# Altium schematic symbol library MCU_ST_STM32H7.SchLib: 191 symbols (part 7 of 8)
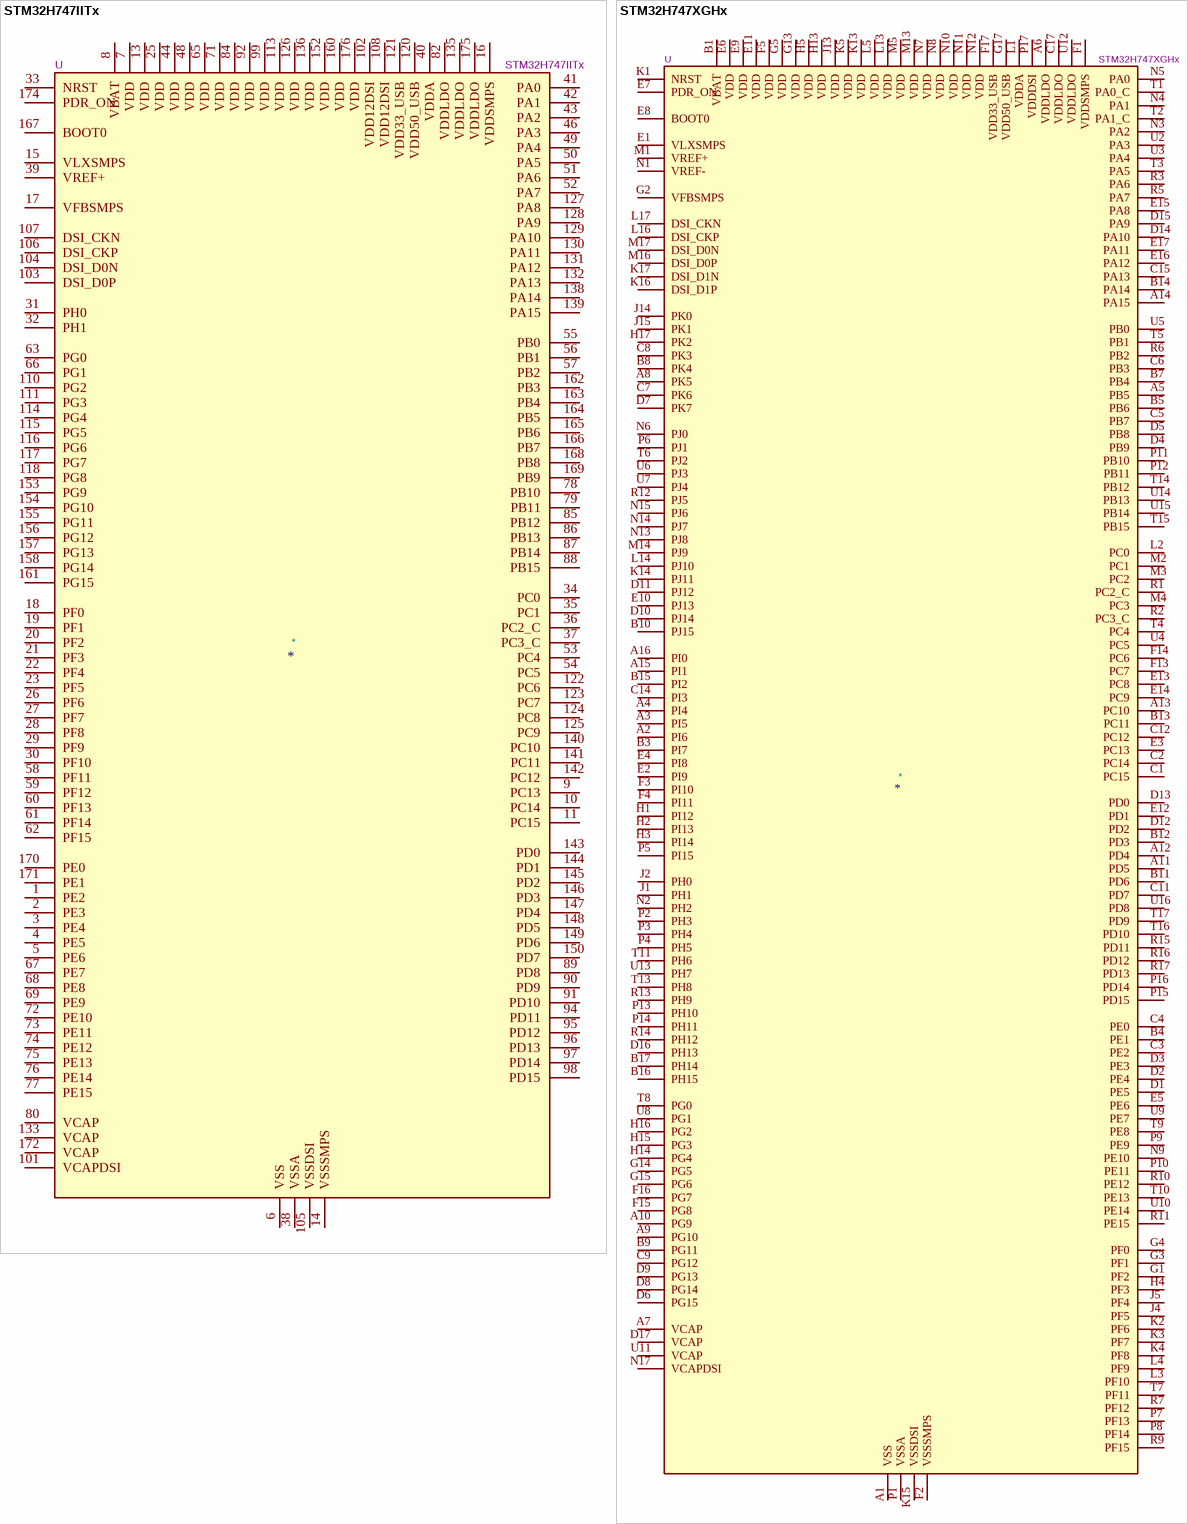
[diagram p72: symbols STM32H747IITx to STM32H747XGHx]

## STM32H747XGHx
designator *  value STM32H747XGHx  Reference: U
ki_keywords: Arm Cortex-M7 STM32H7 STM32H747/757; ki_description: STMicroelectronics Arm Cortex-M7 MCU, 1024KB flash, 1024KB RAM, 480 MHz, 1.62-3.6V, 172 GPIO, TFBGA240; ki_fp_filters: TFBGA*14x14mm*Layout17x17*P0.8mm*; Footprint: Package_BGA:TFBGA-265_14x14mm_Layout17x17_P0.8mm; Datasheet: https://www.st.com/resource/en/datasheet/stm32h747xg.pdf
pins: A1 VSS, A2 PI6, A3 PI5, A4 PI4, A5 PB5, A6 VDDLDO, A7 VCAP, A8 PK5, A9 PG10, A10 PG9, A11 PD5, A12 PD4, A13 PC10, A14 PA15, A15 PI1, A16 PI0, A17 VSS hidden, B1 VBAT, B2 VSS hidden, B3 PI7, B4 PE1, B5 PB6, B6 VSS hidden, B7 PB4, B8 PK4, B9 PG11, B10 PJ15, B11 PD6, B12 PD3, B13 PC11, B14 PA14, B15 PI2, B16 PH15, B17 PH14, C1 PC15, C2 PC14, C3 PE2, C4 PE0, C5 PB7, C6 PB3, C7 PK6, C8 PK3, C9 PG12, C10 VSS hidden, C11 PD7, C12 PC12, C13 VSS hidden, C14 PI3, C15 PA13, C16 VSS hidden, C17 VDDLDO, D1 PE5, D2 PE4, D3 PE3, D4 PB9, D5 PB8, D6 PG15, D7 PK7, D8 PG14, D9 PG13, D10 PJ14, D11 PJ12, D12 PD2, D13 PD0, D14 PA10, D15 PA9, D16 PH13, D17 VCAP, E1 VLXSMPS, E2 PI9, E3 PC13, E4 PI8, E5 PE6, E6 VDD, E7 PDR_ON, E8 BOOT0, E9 VDD, E10 PJ13, E11 VDD, E12 PD1, E13 PC8, E14 PC9, E15 PA8, E16 PA12, E17 PA11, F1 VDDSMPS, F2 VSSSMPS, F3 PI10, F4 PI11, F5 VDD, F13 PC7, F14 PC6, F15 PG8, F16 PG7, F17 VDD33_USB, G1 PF2, G2 VFBSMPS, G3 PF1, G4 PF0, G5 VDD, G7 VSS hidden, G8 VSS hidden, G9 VSS hidden, G10 VSS hidden, G11 VSS hidden, G13 VDD, G14 PG5, G15 PG6, G16 VSS hidden, G17 VDD50_USB, H1 PI12, H2 PI13, H3 PI14, H4 PF3, H5 VDD, H7 VSS hidden, H8 VSS hidden, H9 VSS hidden, H10 VSS hidden, H11 VSS hidden, H13 VDD, H14 PG4, H15 PG3, H16 PG2, H17 PK2, J1 PH1, J2 PH0, J3 VSS hidden, J4 PF5, J5 PF4, J7 VSS hidden, J8 VSS hidden, J9 VSS hidden, J10 VSS hidden, J11 VSS hidden, J13 VDD, J14 PK0, J15 PK1, J16 VSS hidden, J17 VSS hidden, K1 NRST, K2 PF6, K3 PF7, K4 PF8, K5 VDD, K7 VSS hidden, K8 VSS hidden, K9 VSS hidden, K10 VSS hidden, K11 VSS hidden, K13 VDD, K14 PJ11, K15 VSSDSI, K16 DSI_D1P, K17 DSI_D1N, L1 VDDA, L2 PC0, L3 PF10, L4 PF9, L5 VDD, L7 VSS hidden, L8 VSS hidden, L9 VSS hidden, L10 VSS hidden, L11 VSS hidden, L13 VDD, L14 PJ10, L15 VSSDSI hidden, L16 DSI_CKP, L17 DSI_CKN, M1 VREF+, M2 PC1, M3 PC2, M4 PC3, M5 VDD, M13 VDD, M14 PJ9, M15 VSSDSI hidden, M16 DSI_D0P, M17 DSI_D0N, N1 VREF-, N2 PH2, N3 PA2, N4 PA1, N5 PA0, N6 PJ0, N7 VDD, N8 VDD, N9 PE10, N10 VDD, N11 VDD, N12 VDD, N13 PJ8, N14 PJ7, N15 PJ6, N16 VSS hidden, N17 VCAPDSI, P1 VSSA, P2 PH3, P3 PH4, P4 PH5, P5 PI15, P6 PJ1, P7 PF13, P8 PF14, P9 PE9, P10 PE11, P11 PB10, P12 PB11, P13 PH10, P14 PH11, P15 PD15, P16 PD14, P17 VDDDSI, R1 PC2_C, R2 PC3_C, R3 PA6, R4 VSS hidden, R5 PA7, R6 PB2, R7 PF12, R8 VSS hidden, R9 PF15, R10 PE12, R11 PE15, R12 PJ5, R13 PH9, R14 PH12, R15 PD11, R16 PD12, R17 PD13, T1 PA0_C, T2 PA1_C, T3 PA5, T4 PC4, T5 PB1, T6 PJ2, T7 PF11, T8 PG0, T9 PE8, T10 PE13, T11 PH6, T12 VSS hidden, T13 PH8, T14 PB12, T15 PB15, T16 PD10, T17 PD9, U1 VSS hidden, U2 PA3, U3 PA4, U4 PC5, U5 PB0, U6 PJ3, U7 PJ4, U8 PG1, U9 PE7, U10 PE14, U11 VCAP, U12 VDDLDO, U13 PH7, U14 PB13, U15 PB14, U16 PD8, U17 VSS hidden

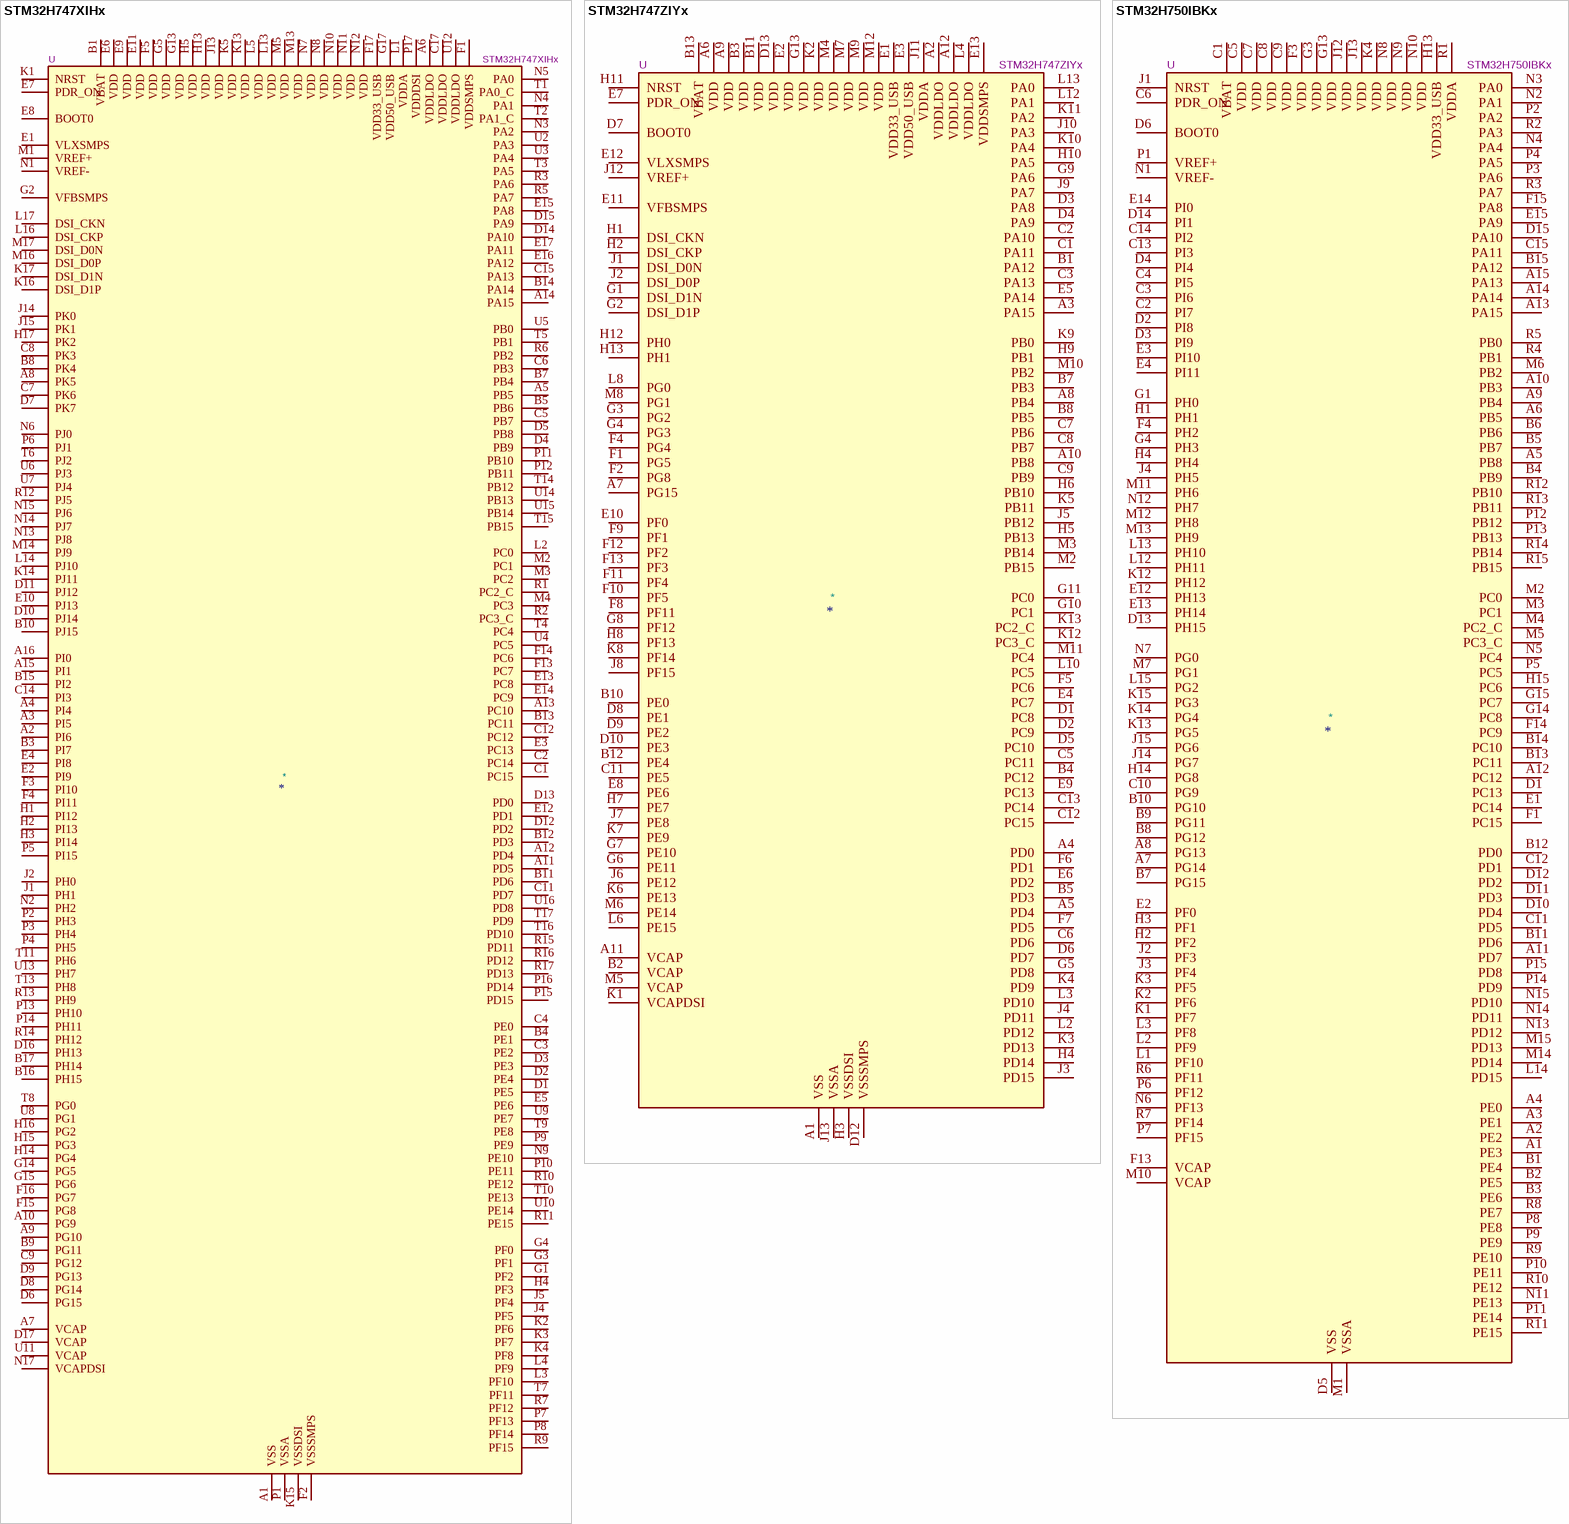
[diagram p57: symbols STM32H747XIHx to STM32H750IBKx]

## STM32H747XIHx
designator *  value STM32H747XIHx  Reference: U
ki_keywords: Arm Cortex-M7 STM32H7 STM32H747/757; ki_description: STMicroelectronics Arm Cortex-M7 MCU, 2048KB flash, 1024KB RAM, 480 MHz, 1.62-3.6V, 172 GPIO, TFBGA240; ki_fp_filters: TFBGA*14x14mm*Layout17x17*P0.8mm*; Footprint: Package_BGA:TFBGA-265_14x14mm_Layout17x17_P0.8mm; Datasheet: https://www.st.com/resource/en/datasheet/stm32h747xi.pdf
pins: A1 VSS, A2 PI6, A3 PI5, A4 PI4, A5 PB5, A6 VDDLDO, A7 VCAP, A8 PK5, A9 PG10, A10 PG9, A11 PD5, A12 PD4, A13 PC10, A14 PA15, A15 PI1, A16 PI0, A17 VSS hidden, B1 VBAT, B2 VSS hidden, B3 PI7, B4 PE1, B5 PB6, B6 VSS hidden, B7 PB4, B8 PK4, B9 PG11, B10 PJ15, B11 PD6, B12 PD3, B13 PC11, B14 PA14, B15 PI2, B16 PH15, B17 PH14, C1 PC15, C2 PC14, C3 PE2, C4 PE0, C5 PB7, C6 PB3, C7 PK6, C8 PK3, C9 PG12, C10 VSS hidden, C11 PD7, C12 PC12, C13 VSS hidden, C14 PI3, C15 PA13, C16 VSS hidden, C17 VDDLDO, D1 PE5, D2 PE4, D3 PE3, D4 PB9, D5 PB8, D6 PG15, D7 PK7, D8 PG14, D9 PG13, D10 PJ14, D11 PJ12, D12 PD2, D13 PD0, D14 PA10, D15 PA9, D16 PH13, D17 VCAP, E1 VLXSMPS, E2 PI9, E3 PC13, E4 PI8, E5 PE6, E6 VDD, E7 PDR_ON, E8 BOOT0, E9 VDD, E10 PJ13, E11 VDD, E12 PD1, E13 PC8, E14 PC9, E15 PA8, E16 PA12, E17 PA11, F1 VDDSMPS, F2 VSSSMPS, F3 PI10, F4 PI11, F5 VDD, F13 PC7, F14 PC6, F15 PG8, F16 PG7, F17 VDD33_USB, G1 PF2, G2 VFBSMPS, G3 PF1, G4 PF0, G5 VDD, G7 VSS hidden, G8 VSS hidden, G9 VSS hidden, G10 VSS hidden, G11 VSS hidden, G13 VDD, G14 PG5, G15 PG6, G16 VSS hidden, G17 VDD50_USB, H1 PI12, H2 PI13, H3 PI14, H4 PF3, H5 VDD, H7 VSS hidden, H8 VSS hidden, H9 VSS hidden, H10 VSS hidden, H11 VSS hidden, H13 VDD, H14 PG4, H15 PG3, H16 PG2, H17 PK2, J1 PH1, J2 PH0, J3 VSS hidden, J4 PF5, J5 PF4, J7 VSS hidden, J8 VSS hidden, J9 VSS hidden, J10 VSS hidden, J11 VSS hidden, J13 VDD, J14 PK0, J15 PK1, J16 VSS hidden, J17 VSS hidden, K1 NRST, K2 PF6, K3 PF7, K4 PF8, K5 VDD, K7 VSS hidden, K8 VSS hidden, K9 VSS hidden, K10 VSS hidden, K11 VSS hidden, K13 VDD, K14 PJ11, K15 VSSDSI, K16 DSI_D1P, K17 DSI_D1N, L1 VDDA, L2 PC0, L3 PF10, L4 PF9, L5 VDD, L7 VSS hidden, L8 VSS hidden, L9 VSS hidden, L10 VSS hidden, L11 VSS hidden, L13 VDD, L14 PJ10, L15 VSSDSI hidden, L16 DSI_CKP, L17 DSI_CKN, M1 VREF+, M2 PC1, M3 PC2, M4 PC3, M5 VDD, M13 VDD, M14 PJ9, M15 VSSDSI hidden, M16 DSI_D0P, M17 DSI_D0N, N1 VREF-, N2 PH2, N3 PA2, N4 PA1, N5 PA0, N6 PJ0, N7 VDD, N8 VDD, N9 PE10, N10 VDD, N11 VDD, N12 VDD, N13 PJ8, N14 PJ7, N15 PJ6, N16 VSS hidden, N17 VCAPDSI, P1 VSSA, P2 PH3, P3 PH4, P4 PH5, P5 PI15, P6 PJ1, P7 PF13, P8 PF14, P9 PE9, P10 PE11, P11 PB10, P12 PB11, P13 PH10, P14 PH11, P15 PD15, P16 PD14, P17 VDDDSI, R1 PC2_C, R2 PC3_C, R3 PA6, R4 VSS hidden, R5 PA7, R6 PB2, R7 PF12, R8 VSS hidden, R9 PF15, R10 PE12, R11 PE15, R12 PJ5, R13 PH9, R14 PH12, R15 PD11, R16 PD12, R17 PD13, T1 PA0_C, T2 PA1_C, T3 PA5, T4 PC4, T5 PB1, T6 PJ2, T7 PF11, T8 PG0, T9 PE8, T10 PE13, T11 PH6, T12 VSS hidden, T13 PH8, T14 PB12, T15 PB15, T16 PD10, T17 PD9, U1 VSS hidden, U2 PA3, U3 PA4, U4 PC5, U5 PB0, U6 PJ3, U7 PJ4, U8 PG1, U9 PE7, U10 PE14, U11 VCAP, U12 VDDLDO, U13 PH7, U14 PB13, U15 PB14, U16 PD8, U17 VSS hidden

## STM32H747ZIYx
designator *  value STM32H747ZIYx  Reference: U
ki_keywords: Arm Cortex-M7 STM32H7 STM32H747/757; ki_description: STMicroelectronics Arm Cortex-M7 MCU, 2048KB flash, 1024KB RAM, 480 MHz, 1.62-3.6V, 101 GPIO, WLCSP156; Footprint: Package_CSP:ST_WLCSP-156_4.96x4.64mm_Layout13x12_P0.35mm; Datasheet: https://www.st.com/resource/en/datasheet/stm32h747zi.pdf; ki_fp_filters: *
pins: A1 VSS, A2 VDDLDO, A3 PA15, A4 PD0, A5 PD4, A6 VDD, A7 PG15, A8 PB4, A9 VDD, A10 PB8, A11 VCAP, A12 VDDLDO, A13 DNC hidden, B1 PA12, B2 VCAP, B3 VDD, B4 PC12, B5 PD3, B6 VSS hidden, B7 PB3, B8 PB5, B9 VSS hidden, B10 PE0, B11 VDD, B12 PE4, B13 VBAT, C1 PA11, C2 PA10, C3 PA13, C4 VSS hidden, C5 PC11, C6 PD6, C7 PB6, C8 PB7, C9 PB9, C10 VSS hidden, C11 PE5, C12 PC15, C13 PC14, D1 PC8, D2 PC9, D3 PA8, D4 PA9, D5 PC10, D6 PD7, D7 BOOT0, D8 PE1, D9 PE2, D10 PE3, D11 VSS hidden, D12 VSSSMPS, D13 VDD, E1 VDD33_USB, E2 VDD, E3 VDD50_USB, E4 PC7, E5 PA14, E6 PD2, E7 PDR_ON, E8 PE6, E9 PC13, E10 PF0, E11 VFBSMPS, E12 VLXSMPS, E13 VDDSMPS, F1 PG5, F2 PG8, F3 VSS hidden, F4 PG4, F5 PC6, F6 PD1, F7 PD5, F8 PF11, F9 PF1, F10 PF5, F11 PF4, F12 PF2, F13 PF3, G1 DSI_D1N, G2 DSI_D1P, G3 PG2, G4 PG3, G5 PD8, G6 PE11, G7 PE10, G8 PF12, G9 PA6, G10 PC1, G11 PC0, G12 VSS hidden, G13 VDD, H1 DSI_CKN, H2 DSI_CKP, H3 VSSDSI, H4 PD14, H5 PB13, H6 PB10, H7 PE7, H8 PF13, H9 PB1, H10 PA5, H11 NRST, H12 PH0, H13 PH1, J1 DSI_D0N, J2 DSI_D0P, J3 PD15, J4 PD11, J5 PB12, J6 PE12, J7 PE8, J8 PF15, J9 PA7, J10 PA3, J11 VDDA, J12 VREF+, J13 VSSA, K1 VCAPDSI, K2 VDD, K3 PD13, K4 PD9, K5 PB11, K6 PE13, K7 PE9, K8 PF14, K9 PB0, K10 PA4, K11 PA2, K12 PC3_C, K13 PC2_C, L1 VSS hidden, L2 PD12, L3 PD10, L4 VDDLDO, L5 VSS hidden, L6 PE15, L7 VSS hidden, L8 PG0, L9 VSS hidden, L10 PC5, L11 VSS hidden, L12 PA1, L13 PA0, M1 VSS hidden, M2 PB15, M3 PB14, M4 VDD, M5 VCAP, M6 PE14, M7 VDD, M8 PG1, M9 VDD, M10 PB2, M11 PC4, M12 VDD, M13 VSS hidden

## STM32H750IBKx
designator *  value STM32H750IBKx  Reference: U
ki_keywords: Arm Cortex-M7 STM32H7 STM32H750 Value line; ki_description: STMicroelectronics Arm Cortex-M7 MCU, 128KB flash, 1024KB RAM, 480 MHz, 1.62-3.6V, 140 GPIO, UFBGA176; ki_fp_filters: *UFBGA*10x10mm*Layout15x15*P0.65mm*; Footprint: Package_BGA:UFBGA-201_10x10mm_Layout15x15_P0.65mm; Datasheet: https://www.st.com/resource/en/datasheet/stm32h750ib.pdf
pins: A1 PE3, A2 PE2, A3 PE1, A4 PE0, A5 PB8, A6 PB5, A7 PG14, A8 PG13, A9 PB4, A10 PB3, A11 PD7, A12 PC12, A13 PA15, A14 PA14, A15 PA13, B1 PE4, B2 PE5, B3 PE6, B4 PB9, B5 PB7, B6 PB6, B7 PG15, B8 PG12, B9 PG11, B10 PG10, B11 PD6, B12 PD0, B13 PC11, B14 PC10, B15 PA12, C1 VBAT, C2 PI7, C3 PI6, C4 PI5, C5 VDD, C6 PDR_ON, C7 VDD, C8 VDD, C9 VDD, C10 PG9, C11 PD5, C12 PD1, C13 PI3, C14 PI2, C15 PA11, D1 PC13, D2 PI8, D3 PI9, D4 PI4, D5 VSS, D6 BOOT0, D7 VSS hidden, D8 VSS hidden, D9 VSS hidden, D10 PD4, D11 PD3, D12 PD2, D13 PH15, D14 PI1, D15 PA10, E1 PC14, E2 PF0, E3 PI10, E4 PI11, E12 PH13, E13 PH14, E14 PI0, E15 PA9, F1 PC15, F2 VSS hidden, F3 VDD, F4 PH2, F6 VSS hidden, F7 VSS hidden, F8 VSS hidden, F9 VSS hidden, F10 VSS hidden, F12 VSS hidden, F13 VCAP, F14 PC9, F15 PA8, G1 PH0, G2 VSS hidden, G3 VDD, G4 PH3, G6 VSS hidden, G7 VSS hidden, G8 VSS hidden, G9 VSS hidden, G10 VSS hidden, G12 VSS hidden, G13 VDD, G14 PC8, G15 PC7, H1 PH1, H2 PF2, H3 PF1, H4 PH4, H6 VSS hidden, H7 VSS hidden, H8 VSS hidden, H9 VSS hidden, H10 VSS hidden, H12 VSS hidden, H13 VDD33_USB, H14 PG8, H15 PC6, J1 NRST, J2 PF3, J3 PF4, J4 PH5, J6 VSS hidden, J7 VSS hidden, J8 VSS hidden, J9 VSS hidden, J10 VSS hidden, J12 VDD, J13 VDD, J14 PG7, J15 PG6, K1 PF7, K2 PF6, K3 PF5, K4 VDD, K6 VSS hidden, K7 VSS hidden, K8 VSS hidden, K9 VSS hidden, K10 VSS hidden, K12 PH12, K13 PG5, K14 PG4, K15 PG3, L1 PF10, L2 PF9, L3 PF8, L4 VSS hidden, L12 PH11, L13 PH10, L14 PD15, L15 PG2, M1 VSSA, M2 PC0, M3 PC1, M4 PC2_C, M5 PC3_C, M6 PB2, M7 PG1, M8 VSS hidden, M9 VSS hidden, M10 VCAP, M11 PH6, M12 PH8, M13 PH9, M14 PD14, M15 PD13, N1 VREF-, N2 PA1, N3 PA0, N4 PA4, N5 PC4, N6 PF13, N7 PG0, N8 VDD, N9 VDD, N10 VDD, N11 PE13, N12 PH7, N13 PD12, N14 PD11, N15 PD10, P1 VREF+, P2 PA2, P3 PA6, P4 PA5, P5 PC5, P6 PF12, P7 PF15, P8 PE8, P9 PE9, P10 PE11, P11 PE14, P12 PB12, P13 PB13, P14 PD9, P15 PD8, R1 VDDA, R2 PA3, R3 PA7, R4 PB1, R5 PB0, R6 PF11, R7 PF14, R8 PE7, R9 PE10, R10 PE12, R11 PE15, R12 PB10, R13 PB11, R14 PB14, R15 PB15

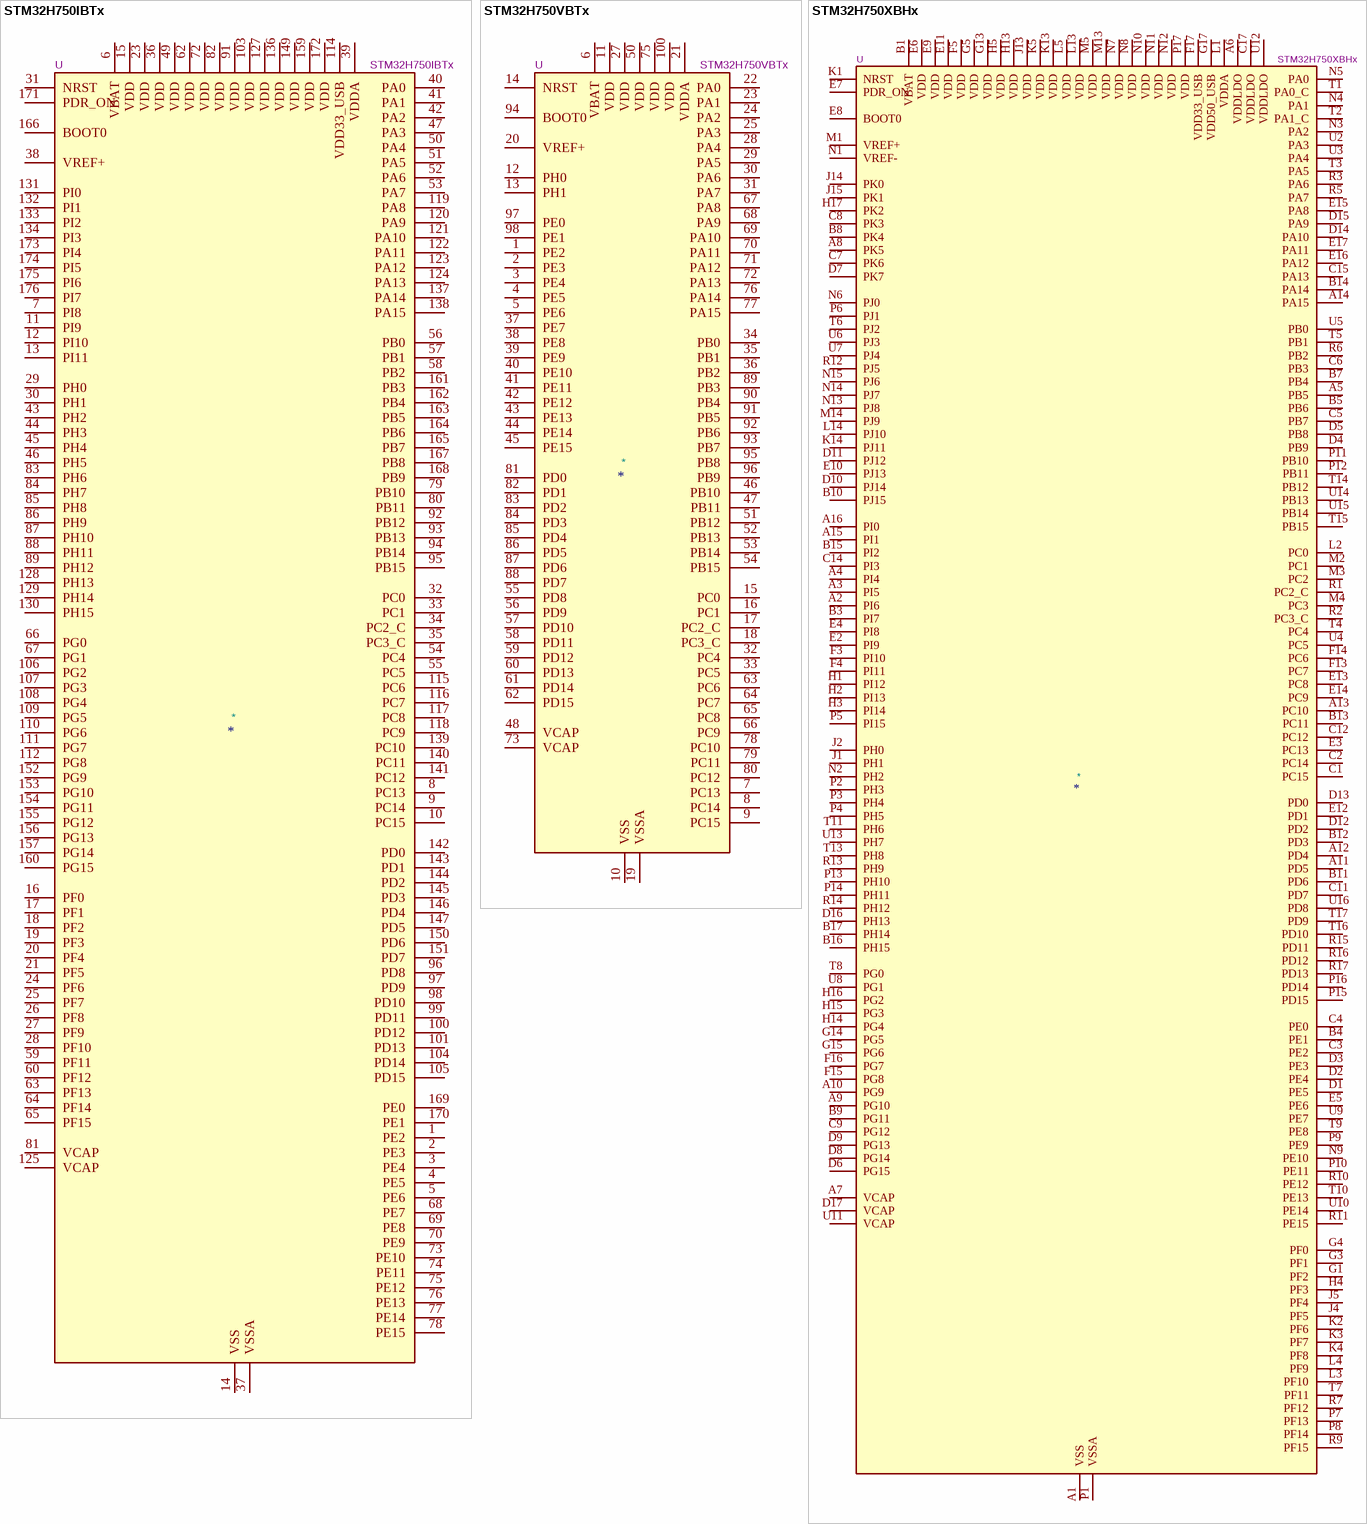
[diagram p58: symbols STM32H750IBTx to STM32H750XBHx]

## STM32H750IBTx
designator *  value STM32H750IBTx  Reference: U
ki_keywords: Arm Cortex-M7 STM32H7 STM32H750 Value line; ki_description: STMicroelectronics Arm Cortex-M7 MCU, 128KB flash, 1024KB RAM, 480 MHz, 1.62-3.6V, 140 GPIO, LQFP176; ki_fp_filters: LQFP*24x24mm*P0.5mm*; Footprint: Package_QFP:LQFP-176_24x24mm_P0.5mm; Datasheet: https://www.st.com/resource/en/datasheet/stm32h750ib.pdf
pins: 1 PE2, 2 PE3, 3 PE4, 4 PE5, 5 PE6, 6 VBAT, 7 PI8, 8 PC13, 9 PC14, 10 PC15, 11 PI9, 12 PI10, 13 PI11, 14 VSS, 15 VDD, 16 PF0, 17 PF1, 18 PF2, 19 PF3, 20 PF4, 21 PF5, 22 VSS hidden, 23 VDD, 24 PF6, 25 PF7, 26 PF8, 27 PF9, 28 PF10, 29 PH0, 30 PH1, 31 NRST, 32 PC0, 33 PC1, 34 PC2_C, 35 PC3_C, 36 VDD, 37 VSSA, 38 VREF+, 39 VDDA, 40 PA0, 41 PA1, 42 PA2, 43 PH2, 44 PH3, 45 PH4, 46 PH5, 47 PA3, 48 VSS hidden, 49 VDD, 50 PA4, 51 PA5, 52 PA6, 53 PA7, 54 PC4, 55 PC5, 56 PB0, 57 PB1, 58 PB2, 59 PF11, 60 PF12, 61 VSS hidden, 62 VDD, 63 PF13, 64 PF14, 65 PF15, 66 PG0, 67 PG1, 68 PE7, 69 PE8, 70 PE9, 71 VSS hidden, 72 VDD, 73 PE10, 74 PE11, 75 PE12, 76 PE13, 77 PE14, 78 PE15, 79 PB10, 80 PB11, 81 VCAP, 82 VDD, 83 PH6, 84 PH7, 85 PH8, 86 PH9, 87 PH10, 88 PH11, 89 PH12, 90 VSS hidden, 91 VDD, 92 PB12, 93 PB13, 94 PB14, 95 PB15, 96 PD8, 97 PD9, 98 PD10, 99 PD11, 100 PD12, 101 PD13, 102 VSS hidden, 103 VDD, 104 PD14, 105 PD15, 106 PG2, 107 PG3, 108 PG4, 109 PG5, 110 PG6, 111 PG7, 112 PG8, 113 VSS hidden, 114 VDD33_USB, 115 PC6, 116 PC7, 117 PC8, 118 PC9, 119 PA8, 120 PA9, 121 PA10, 122 PA11, 123 PA12, 124 PA13, 125 VCAP, 126 VSS hidden, 127 VDD, 128 PH13, 129 PH14, 130 PH15, 131 PI0, 132 PI1, 133 PI2, 134 PI3, 135 VSS hidden, 136 VDD, 137 PA14, 138 PA15, 139 PC10, 140 PC11, 141 PC12, 142 PD0, 143 PD1, 144 PD2, 145 PD3, 146 PD4, 147 PD5, 148 VSS hidden, 149 VDD, 150 PD6, 151 PD7, 152 PG9, 153 PG10, 154 PG11, 155 PG12, 156 PG13, 157 PG14, 158 VSS hidden, 159 VDD, 160 PG15, 161 PB3, 162 PB4, 163 PB5, 164 PB6, 165 PB7, 166 BOOT0, 167 PB8, 168 PB9, 169 PE0, 170 PE1, 171 PDR_ON, 172 VDD, 173 PI4, 174 PI5, 175 PI6, 176 PI7

## STM32H750VBTx
designator *  value STM32H750VBTx  Reference: U
ki_keywords: Arm Cortex-M7 STM32H7 STM32H750 Value line; ki_description: STMicroelectronics Arm Cortex-M7 MCU, 128KB flash, 1024KB RAM, 480 MHz, 1.71-3.6V, 82 GPIO, LQFP100; ki_fp_filters: LQFP*14x14mm*P0.5mm*; Footprint: Package_QFP:LQFP-100_14x14mm_P0.5mm; Datasheet: https://www.st.com/resource/en/datasheet/stm32h750vb.pdf
pins: 1 PE2, 2 PE3, 3 PE4, 4 PE5, 5 PE6, 6 VBAT, 7 PC13, 8 PC14, 9 PC15, 10 VSS, 11 VDD, 12 PH0, 13 PH1, 14 NRST, 15 PC0, 16 PC1, 17 PC2_C, 18 PC3_C, 19 VSSA, 20 VREF+, 21 VDDA, 22 PA0, 23 PA1, 24 PA2, 25 PA3, 26 VSS hidden, 27 VDD, 28 PA4, 29 PA5, 30 PA6, 31 PA7, 32 PC4, 33 PC5, 34 PB0, 35 PB1, 36 PB2, 37 PE7, 38 PE8, 39 PE9, 40 PE10, 41 PE11, 42 PE12, 43 PE13, 44 PE14, 45 PE15, 46 PB10, 47 PB11, 48 VCAP, 49 VSS hidden, 50 VDD, 51 PB12, 52 PB13, 53 PB14, 54 PB15, 55 PD8, 56 PD9, 57 PD10, 58 PD11, 59 PD12, 60 PD13, 61 PD14, 62 PD15, 63 PC6, 64 PC7, 65 PC8, 66 PC9, 67 PA8, 68 PA9, 69 PA10, 70 PA11, 71 PA12, 72 PA13, 73 VCAP, 74 VSS hidden, 75 VDD, 76 PA14, 77 PA15, 78 PC10, 79 PC11, 80 PC12, 81 PD0, 82 PD1, 83 PD2, 84 PD3, 85 PD4, 86 PD5, 87 PD6, 88 PD7, 89 PB3, 90 PB4, 91 PB5, 92 PB6, 93 PB7, 94 BOOT0, 95 PB8, 96 PB9, 97 PE0, 98 PE1, 99 VSS hidden, 100 VDD

## STM32H750XBHx
designator *  value STM32H750XBHx  Reference: U
ki_keywords: Arm Cortex-M7 STM32H7 STM32H750 Value line; ki_description: STMicroelectronics Arm Cortex-M7 MCU, 128KB flash, 1024KB RAM, 480 MHz, 1.62-3.6V, 172 GPIO, TFBGA240; ki_fp_filters: TFBGA*14x14mm*Layout17x17*P0.8mm*; Footprint: Package_BGA:TFBGA-265_14x14mm_Layout17x17_P0.8mm; Datasheet: https://www.st.com/resource/en/datasheet/stm32h750xb.pdf
pins: A1 VSS, A2 PI6, A3 PI5, A4 PI4, A5 PB5, A6 VDDLDO, A7 VCAP, A8 PK5, A9 PG10, A10 PG9, A11 PD5, A12 PD4, A13 PC10, A14 PA15, A15 PI1, A16 PI0, A17 VSS hidden, B1 VBAT, B2 VSS hidden, B3 PI7, B4 PE1, B5 PB6, B6 VSS hidden, B7 PB4, B8 PK4, B9 PG11, B10 PJ15, B11 PD6, B12 PD3, B13 PC11, B14 PA14, B15 PI2, B16 PH15, B17 PH14, C1 PC15, C2 PC14, C3 PE2, C4 PE0, C5 PB7, C6 PB3, C7 PK6, C8 PK3, C9 PG12, C10 VSS hidden, C11 PD7, C12 PC12, C13 VSS hidden, C14 PI3, C15 PA13, C16 VSS hidden, C17 VDDLDO, D1 PE5, D2 PE4, D3 PE3, D4 PB9, D5 PB8, D6 PG15, D7 PK7, D8 PG14, D9 PG13, D10 PJ14, D11 PJ12, D12 PD2, D13 PD0, D14 PA10, D15 PA9, D16 PH13, D17 VCAP, E1 NC hidden, E2 PI9, E3 PC13, E4 PI8, E5 PE6, E6 VDD, E7 PDR_ON, E8 BOOT0, E9 VDD, E10 PJ13, E11 VDD, E12 PD1, E13 PC8, E14 PC9, E15 PA8, E16 PA12, E17 PA11, F1 VSS hidden, F2 VSS hidden, F3 PI10, F4 PI11, F5 VDD, F13 PC7, F14 PC6, F15 PG8, F16 PG7, F17 VDD33_USB, G1 PF2, G2 VSS hidden, G3 PF1, G4 PF0, G5 VDD, G7 VSS hidden, G8 VSS hidden, G9 VSS hidden, G10 VSS hidden, G11 VSS hidden, G13 VDD, G14 PG5, G15 PG6, G16 VSS hidden, G17 VDD50_USB, H1 PI12, H2 PI13, H3 PI14, H4 PF3, H5 VDD, H7 VSS hidden, H8 VSS hidden, H9 VSS hidden, H10 VSS hidden, H11 VSS hidden, H13 VDD, H14 PG4, H15 PG3, H16 PG2, H17 PK2, J1 PH1, J2 PH0, J3 VSS hidden, J4 PF5, J5 PF4, J7 VSS hidden, J8 VSS hidden, J9 VSS hidden, J10 VSS hidden, J11 VSS hidden, J13 VDD, J14 PK0, J15 PK1, J16 VSS hidden, J17 VSS hidden, K1 NRST, K2 PF6, K3 PF7, K4 PF8, K5 VDD, K7 VSS hidden, K8 VSS hidden, K9 VSS hidden, K10 VSS hidden, K11 VSS hidden, K13 VDD, K14 PJ11, K15 VSS hidden, K16 NC hidden, K17 NC hidden, L1 VDDA, L2 PC0, L3 PF10, L4 PF9, L5 VDD, L7 VSS hidden, L8 VSS hidden, L9 VSS hidden, L10 VSS hidden, L11 VSS hidden, L13 VDD, L14 PJ10, L15 VSS hidden, L16 NC hidden, L17 NC hidden, M1 VREF+, M2 PC1, M3 PC2, M4 PC3, M5 VDD, M13 VDD, M14 PJ9, M15 VSS hidden, M16 NC hidden, M17 NC hidden, N1 VREF-, N2 PH2, N3 PA2, N4 PA1, N5 PA0, N6 PJ0, N7 VDD, N8 VDD, N9 PE10, N10 VDD, N11 VDD, N12 VDD, N13 PJ8, N14 PJ7, N15 PJ6, N16 VSS hidden, N17 NC hidden, P1 VSSA, P2 PH3, P3 PH4, P4 PH5, P5 PI15, P6 PJ1, P7 PF13, P8 PF14, P9 PE9, P10 PE11, P11 PB10, P12 PB11, P13 PH10, P14 PH11, P15 PD15, P16 PD14, P17 VDD, R1 PC2_C, R2 PC3_C, R3 PA6, R4 VSS hidden, R5 PA7, R6 PB2, R7 PF12, R8 VSS hidden, R9 PF15, R10 PE12, R11 PE15, R12 PJ5, R13 PH9, R14 PH12, R15 PD11, R16 PD12, R17 PD13, T1 PA0_C, T2 PA1_C, T3 PA5, T4 PC4, T5 PB1, T6 PJ2, T7 PF11, T8 PG0, T9 PE8, T10 PE13, T11 PH6, T12 VSS hidden, T13 PH8, T14 PB12, T15 PB15, T16 PD10, T17 PD9, U1 VSS hidden, U2 PA3, U3 PA4, U4 PC5, U5 PB0, U6 PJ3, U7 PJ4, U8 PG1, U9 PE7, U10 PE14, U11 VCAP, U12 VDDLDO, U13 PH7, U14 PB13, U15 PB14, U16 PD8, U17 VSS hidden